# Altium footprint library MainFPs.PcbLib: 215 footprints (part 5 of 14) (continued)
## DIP24 [mm]
pads (24):
  rect 2.5x1.5 hole 0.8: 1(0,0)
  oval 2.5x1.5 hole 0.8: 2(0,-2.54) 3(0,-5.08) 4(0,-7.62) 5(0,-10.16) 6(0,-12.7) 7(0,-15.24) 8(0,-17.78) 9(0,-20.32) 10(0,-22.86) 11(0,-25.4) 12(0,-27.94) 13(7.62,-27.94) 14(7.62,-25.4) 15(7.62,-22.86) 16(7.62,-20.32) 17(7.62,-17.78) 18(7.62,-15.24) 19(7.62,-12.7) 20(7.62,-10.16) 21(7.62,-7.62) 22(7.62,-5.08) 23(7.62,-2.54) 24(7.62,0)
Top Overlay:
  lines w0.2: 3.048,1.27 1.524,1.27 1.524,-29.21 6.096,-29.21 6.096,1.27 4.572,1.27
  lines w0.25: 3.092,1.27 ccw(c3.81,1.27) 4.528,1.27
  text "DIP24" at 4.826,-18.415 h2
Top Draw:
  lines w0.2: 0.254,-28.194 1.524,-29.464 ; 0.254,-26.924 2.794,-29.464 ; 0.254,-25.654 1.524,-26.924 4.064,-29.464 ; 0.254,-24.384 2.794,-26.924 5.334,-29.464 ; 0.254,-23.114 1.524,-24.384 4.064,-26.924 6.604,-29.464 ; 0.254,-21.844 2.794,-24.384 5.334,-26.924 7.366,-28.956 ; 0.254,-20.574 1.524,-21.844 4.064,-24.384 6.604,-26.924 7.366,-27.686 ; 0.254,-19.304 2.794,-21.844 5.334,-24.384 7.366,-26.416 ; 0.254,-18.034 1.524,-19.304 4.064,-21.844 6.604,-24.384 7.366,-25.146 ; 0.254,-16.764 2.794,-19.304 5.334,-21.844 7.366,-23.876 ; 0.254,-15.494 1.524,-16.764 4.064,-19.304 6.604,-21.844 7.366,-22.606 ; 0.254,-14.224 2.794,-16.764 5.334,-19.304 7.366,-21.336 ; 0.254,-12.954 1.524,-14.224 4.064,-16.764 6.604,-19.304 7.366,-20.066 ; 0.254,-11.684 2.794,-14.224 5.334,-16.764 7.366,-18.796 ; 0.254,-10.414 1.524,-11.684 ; 0.254,-9.144 2.794,-11.684 ; 0.254,-7.874 4.064,-11.684 6.604,-14.224 7.366,-14.986 ; 0.254,-6.604 5.334,-11.684 7.366,-13.716 ; 0.254,-5.334 6.604,-11.684 7.366,-12.446 ; 0.254,-4.064 7.366,-11.176 ; 0.254,-2.794 7.366,-9.906 ; 0.254,-1.524 7.366,-8.636 ; 0.254,-0.254 7.366,-7.366 ; 0.254,1.016 7.366,-6.096 ; 1.016,1.524 7.366,-4.826 ; 2.286,1.524 7.366,-3.556 ; 3.556,1.524 7.366,-2.286 ; 4.826,1.524 7.366,-1.016 ; 6.096,1.524 7.366,0.254 ; 7.366,-17.526 6.604,-16.764 4.064,-14.224 ; 7.366,-16.256 5.334,-14.224 ; 2.794,-11.684 5.334,-14.224 ; 2.794,-11.684 5.334,-14.224 ; 4.064,-14.224 1.27,-11.43 4.064,-14.224 ; 0.254,-29.464 0.254,1.524 7.366,1.524 7.366,-29.464 0.254,-29.464
Top Info:
  text "'.Comment'" at -0.381,-30.861 h1
3D body: height 2.03, standoff 0.25, extent 0.508,-29.21 7.112,1.27
3D body: height 3, standoff 2, extent 0.508,-29.21 7.112,1.27
3D body: height 2.09, standoff 0.31, extent -0.127,-5.58 0.508,-4.58
3D body: height 0.38, standoff -3, extent -0.127,-5.334 0.127,-4.826
3D body: height 2.09, standoff 0.31, extent -0.127,-8.12 0.508,-7.12
3D body: height 0.38, standoff -3, extent -0.127,-7.874 0.127,-7.366
3D body: height 2.09, standoff 0.31, extent 7.112,-8.12 7.747,-7.12
3D body: height 0.38, standoff -3, extent 7.493,-7.874 7.747,-7.366
3D body: height 2.09, standoff 0.31, extent 7.112,-5.58 7.747,-4.58
3D body: height 0.38, standoff -3, extent 7.493,-5.334 7.747,-4.826
3D body: height 2.09, standoff 0.31, extent -0.127,-0.5 0.508,0.5
3D body: height 0.38, standoff -3, extent -0.127,-0.254 0.127,0.254
3D body: height 2.09, standoff 0.31, extent -0.127,-3.04 0.508,-2.04
3D body: height 0.38, standoff -3, extent -0.127,-2.794 0.127,-2.286
3D body: height 2.09, standoff 0.31, extent 7.112,-3.04 7.747,-2.04
3D body: height 0.38, standoff -3, extent 7.493,-2.794 7.747,-2.286
3D body: height 2.09, standoff 0.31, extent 7.112,-0.5 7.747,0.5
3D body: height 0.38, standoff -3, extent 7.493,-0.254 7.747,0.254
3D body: height 2.09, standoff 0.31, extent -0.127,-15.74 0.508,-14.74
3D body: height 0.38, standoff -3, extent -0.127,-15.494 0.127,-14.986
3D body: height 2.09, standoff 0.31, extent -0.127,-18.28 0.508,-17.28
3D body: height 0.38, standoff -3, extent -0.127,-18.034 0.127,-17.526
3D body: height 2.09, standoff 0.31, extent 7.112,-18.28 7.747,-17.28
3D body: height 0.38, standoff -3, extent 7.493,-18.034 7.747,-17.526
3D body: height 2.09, standoff 0.31, extent 7.112,-15.74 7.747,-14.74
3D body: height 0.38, standoff -3, extent 7.493,-15.494 7.747,-14.986
3D body: height 2.09, standoff 0.31, extent -0.127,-10.66 0.508,-9.66
3D body: height 0.38, standoff -3, extent -0.127,-10.414 0.127,-9.906
3D body: height 2.09, standoff 0.31, extent -0.127,-13.2 0.508,-12.2
3D body: height 0.38, standoff -3, extent -0.127,-12.954 0.127,-12.446
3D body: height 2.09, standoff 0.31, extent 7.112,-13.2 7.747,-12.2
3D body: height 0.38, standoff -3, extent 7.493,-12.954 7.747,-12.446
3D body: height 2.09, standoff 0.31, extent 7.112,-10.66 7.747,-9.66
3D body: height 0.38, standoff -3, extent 7.493,-10.414 7.747,-9.906
3D body: height 2.09, standoff 0.31, extent -0.127,-25.9 0.508,-24.9
3D body: height 0.38, standoff -3, extent -0.127,-25.654 0.127,-25.146
3D body: height 2.09, standoff 0.31, extent -0.127,-28.44 0.508,-27.44
3D body: height 0.38, standoff -3, extent -0.127,-28.194 0.127,-27.686
3D body: height 2.09, standoff 0.31, extent 7.112,-28.44 7.747,-27.44
3D body: height 0.38, standoff -3, extent 7.493,-28.194 7.747,-27.686
3D body: height 2.09, standoff 0.31, extent 7.112,-25.9 7.747,-24.9
3D body: height 0.38, standoff -3, extent 7.493,-25.654 7.747,-25.146
3D body: height 2.09, standoff 0.31, extent -0.127,-20.82 0.508,-19.82
3D body: height 0.38, standoff -3, extent -0.127,-20.574 0.127,-20.066
3D body: height 2.09, standoff 0.31, extent -0.127,-23.36 0.508,-22.36
3D body: height 0.38, standoff -3, extent -0.127,-23.114 0.127,-22.606
3D body: height 2.09, standoff 0.31, extent 7.112,-23.36 7.747,-22.36
3D body: height 0.38, standoff -3, extent 7.493,-23.114 7.747,-22.606
3D body: height 2.09, standoff 0.31, extent 7.112,-20.82 7.747,-19.82
3D body: height 0.38, standoff -3, extent 7.493,-20.574 7.747,-20.066

## DIP26 [mm]
pads (26):
  rect 2.5x1.5 hole 0.8: 1(0,0)
  oval 2.5x1.5 hole 0.8: 2(0,-2.54) 3(0,-5.08) 4(0,-7.62) 5(0,-10.16) 6(0,-12.7) 7(0,-15.24) 8(0,-17.78) 9(0,-20.32) 10(0,-22.86) 11(0,-25.4) 12(0,-27.94) 13(0,-30.48) 14(7.62,-30.48) 15(7.62,-27.94) 16(7.62,-25.4) 17(7.62,-22.86) 18(7.62,-20.32) 19(7.62,-17.78) 20(7.62,-15.24) 21(7.62,-12.7) 22(7.62,-10.16) 23(7.62,-7.62) 24(7.62,-5.08) 25(7.62,-2.54) 26(7.62,0)
Top Overlay:
  lines w0.2: 3.048,1.27 1.524,1.27 1.524,-31.75 6.096,-31.75 6.096,1.27 4.572,1.27
  lines w0.25: 3.092,1.27 ccw(c3.81,1.27) 4.528,1.27
  text "DIP26" at 4.953,-19.685 h2
Top Draw:
  lines w0.2: 0.254,-30.734 1.524,-32.004 ; 0.254,-29.464 2.794,-32.004 ; 0.254,-28.194 1.524,-29.464 4.064,-32.004 ; 0.254,-26.924 2.794,-29.464 5.334,-32.004 ; 0.254,-25.654 1.524,-26.924 4.064,-29.464 6.604,-32.004 ; 0.254,-24.384 2.794,-26.924 5.334,-29.464 7.366,-31.496 ; 0.254,-23.114 1.524,-24.384 4.064,-26.924 6.604,-29.464 7.366,-30.226 ; 0.254,-21.844 2.794,-24.384 5.334,-26.924 7.366,-28.956 ; 0.254,-20.574 1.524,-21.844 4.064,-24.384 6.604,-26.924 7.366,-27.686 ; 0.254,-19.304 2.794,-21.844 5.334,-24.384 7.366,-26.416 ; 0.254,-18.034 1.524,-19.304 4.064,-21.844 6.604,-24.384 7.366,-25.146 ; 0.254,-16.764 2.794,-19.304 5.334,-21.844 7.366,-23.876 ; 0.254,-15.494 1.524,-16.764 4.064,-19.304 6.604,-21.844 7.366,-22.606 ; 0.254,-14.224 2.794,-16.764 5.334,-19.304 7.366,-21.336 ; 0.254,-12.954 1.524,-14.224 4.064,-16.764 6.604,-19.304 7.366,-20.066 ; 0.254,-11.684 2.794,-14.224 5.334,-16.764 7.366,-18.796 ; 0.254,-10.414 1.524,-11.684 ; 0.254,-9.144 2.794,-11.684 ; 0.254,-7.874 4.064,-11.684 6.604,-14.224 7.366,-14.986 ; 0.254,-6.604 5.334,-11.684 7.366,-13.716 ; 0.254,-5.334 6.604,-11.684 7.366,-12.446 ; 0.254,-4.064 7.366,-11.176 ; 0.254,-2.794 7.366,-9.906 ; 0.254,-1.524 7.366,-8.636 ; 0.254,-0.254 7.366,-7.366 ; 0.254,1.016 7.366,-6.096 ; 1.016,1.524 7.366,-4.826 ; 2.286,1.524 7.366,-3.556 ; 3.556,1.524 7.366,-2.286 ; 4.826,1.524 7.366,-1.016 ; 6.096,1.524 7.366,0.254 ; 7.366,-17.526 6.604,-16.764 4.064,-14.224 ; 7.366,-16.256 5.334,-14.224 ; 2.794,-11.684 5.334,-14.224 ; 2.794,-11.684 5.334,-14.224 ; 4.064,-14.224 1.27,-11.43 4.064,-14.224 ; 0.254,-32.004 0.254,1.524 7.366,1.524 7.366,1.27 7.366,-32.004 0.254,-32.004
Top Info:
  text "'.Comment'" at -0.381,-33.401 h1
3D body: height 0.38, standoff -3, extent 7.493,-30.734 7.747,-30.226
3D body: height 2.09, standoff 0.31, extent 7.112,-30.98 7.747,-29.98
3D body: height 0.38, standoff -3, extent -0.127,-30.734 0.127,-30.226
3D body: height 2.09, standoff 0.31, extent -0.127,-30.98 0.508,-29.98
3D body: height 0.38, standoff -3, extent 7.493,-20.574 7.747,-20.066
3D body: height 2.09, standoff 0.31, extent 7.112,-20.82 7.747,-19.82
3D body: height 0.38, standoff -3, extent 7.493,-23.114 7.747,-22.606
3D body: height 2.09, standoff 0.31, extent 7.112,-23.36 7.747,-22.36
3D body: height 0.38, standoff -3, extent -0.127,-23.114 0.127,-22.606
3D body: height 2.09, standoff 0.31, extent -0.127,-23.36 0.508,-22.36
3D body: height 0.38, standoff -3, extent -0.127,-20.574 0.127,-20.066
3D body: height 2.09, standoff 0.31, extent -0.127,-20.82 0.508,-19.82
3D body: height 0.38, standoff -3, extent 7.493,-25.654 7.747,-25.146
3D body: height 2.09, standoff 0.31, extent 7.112,-25.9 7.747,-24.9
3D body: height 0.38, standoff -3, extent 7.493,-28.194 7.747,-27.686
3D body: height 2.09, standoff 0.31, extent 7.112,-28.44 7.747,-27.44
3D body: height 0.38, standoff -3, extent -0.127,-28.194 0.127,-27.686
3D body: height 2.09, standoff 0.31, extent -0.127,-28.44 0.508,-27.44
3D body: height 0.38, standoff -3, extent -0.127,-25.654 0.127,-25.146
3D body: height 2.09, standoff 0.31, extent -0.127,-25.9 0.508,-24.9
3D body: height 0.38, standoff -3, extent 7.493,-10.414 7.747,-9.906
3D body: height 2.09, standoff 0.31, extent 7.112,-10.66 7.747,-9.66
3D body: height 0.38, standoff -3, extent 7.493,-12.954 7.747,-12.446
3D body: height 2.09, standoff 0.31, extent 7.112,-13.2 7.747,-12.2
3D body: height 0.38, standoff -3, extent -0.127,-12.954 0.127,-12.446
3D body: height 2.09, standoff 0.31, extent -0.127,-13.2 0.508,-12.2
3D body: height 0.38, standoff -3, extent -0.127,-10.414 0.127,-9.906
3D body: height 2.09, standoff 0.31, extent -0.127,-10.66 0.508,-9.66
3D body: height 0.38, standoff -3, extent 7.493,-15.494 7.747,-14.986
3D body: height 2.09, standoff 0.31, extent 7.112,-15.74 7.747,-14.74
3D body: height 0.38, standoff -3, extent 7.493,-18.034 7.747,-17.526
3D body: height 2.09, standoff 0.31, extent 7.112,-18.28 7.747,-17.28
3D body: height 0.38, standoff -3, extent -0.127,-18.034 0.127,-17.526
3D body: height 2.09, standoff 0.31, extent -0.127,-18.28 0.508,-17.28
3D body: height 0.38, standoff -3, extent -0.127,-15.494 0.127,-14.986
3D body: height 2.09, standoff 0.31, extent -0.127,-15.74 0.508,-14.74
3D body: height 0.38, standoff -3, extent 7.493,-0.254 7.747,0.254
3D body: height 2.09, standoff 0.31, extent 7.112,-0.5 7.747,0.5
3D body: height 0.38, standoff -3, extent 7.493,-2.794 7.747,-2.286
3D body: height 2.09, standoff 0.31, extent 7.112,-3.04 7.747,-2.04
3D body: height 0.38, standoff -3, extent -0.127,-2.794 0.127,-2.286
3D body: height 2.09, standoff 0.31, extent -0.127,-3.04 0.508,-2.04
3D body: height 0.38, standoff -3, extent -0.127,-0.254 0.127,0.254
3D body: height 2.09, standoff 0.31, extent -0.127,-0.5 0.508,0.5
3D body: height 0.38, standoff -3, extent 7.493,-5.334 7.747,-4.826
3D body: height 2.09, standoff 0.31, extent 7.112,-5.58 7.747,-4.58
3D body: height 0.38, standoff -3, extent 7.493,-7.874 7.747,-7.366
3D body: height 2.09, standoff 0.31, extent 7.112,-8.12 7.747,-7.12
3D body: height 0.38, standoff -3, extent -0.127,-7.874 0.127,-7.366
3D body: height 2.09, standoff 0.31, extent -0.127,-8.12 0.508,-7.12
3D body: height 0.38, standoff -3, extent -0.127,-5.334 0.127,-4.826
3D body: height 2.09, standoff 0.31, extent -0.127,-5.58 0.508,-4.58
3D body: height 2.03, standoff 0.25, extent 0.508,-31.75 7.112,1.27
3D body: height 3, standoff 2, extent 0.508,-31.75 7.112,1.27

## DIP28 [mm]
pads (28):
  rect 2.5x1.5 hole 0.8: 1(0,0)
  oval 2.5x1.5 hole 0.8: 2(0,-2.54) 3(0,-5.08) 4(0,-7.62) 5(0,-10.16) 6(0,-12.7) 7(0,-15.24) 8(0,-17.78) 9(0,-20.32) 10(0,-22.86) 11(0,-25.4) 12(0,-27.94) 13(0,-30.48) 14(0,-33.02) 15(7.62,-33.02) 16(7.62,-30.48) 17(7.62,-27.94) 18(7.62,-25.4) 19(7.62,-22.86) 20(7.62,-20.32) 21(7.62,-17.78) 22(7.62,-15.24) 23(7.62,-12.7) 24(7.62,-10.16) 25(7.62,-7.62) 26(7.62,-5.08) 27(7.62,-2.54) 28(7.62,0)
Top Overlay:
  lines w0.2: 3.048,1.27 1.524,1.27 1.524,-34.29 6.096,-34.29 6.096,1.27 4.572,1.27
  lines w0.25: 3.092,1.27 ccw(c3.81,1.27) 4.528,1.27
  text "DIP28" at 4.445,-19.304 h1.27
Top Draw:
  lines w0.2: 0.254,-33.274 1.524,-34.544 ; 0.254,-32.004 2.794,-34.544 ; 0.254,-30.734 1.524,-32.004 4.064,-34.544 ; 0.254,-29.464 2.794,-32.004 5.334,-34.544 ; 0.254,-28.194 1.524,-29.464 4.064,-32.004 6.604,-34.544 ; 0.254,-26.924 2.794,-29.464 5.334,-32.004 7.366,-34.036 ; 0.254,-25.654 1.524,-26.924 4.064,-29.464 6.604,-32.004 7.366,-32.766 ; 0.254,-24.384 2.794,-26.924 5.334,-29.464 7.366,-31.496 ; 0.254,-23.114 1.524,-24.384 4.064,-26.924 6.604,-29.464 7.366,-30.226 ; 0.254,-21.844 2.794,-24.384 5.334,-26.924 7.366,-28.956 ; 0.254,-20.574 1.524,-21.844 4.064,-24.384 6.604,-26.924 7.366,-27.686 ; 0.254,-19.304 2.794,-21.844 5.334,-24.384 7.366,-26.416 ; 0.254,-18.034 1.524,-19.304 4.064,-21.844 6.604,-24.384 7.366,-25.146 ; 0.254,-16.764 2.794,-19.304 5.334,-21.844 7.366,-23.876 ; 0.254,-15.494 1.524,-16.764 4.064,-19.304 6.604,-21.844 7.366,-22.606 ; 0.254,-14.224 2.794,-16.764 5.334,-19.304 7.366,-21.336 ; 0.254,-12.954 1.524,-14.224 4.064,-16.764 6.604,-19.304 7.366,-20.066 ; 0.254,-11.684 2.794,-14.224 5.334,-16.764 7.366,-18.796 ; 0.254,-10.414 1.524,-11.684 ; 0.254,-9.144 2.794,-11.684 ; 0.254,-7.874 4.064,-11.684 6.604,-14.224 7.366,-14.986 ; 0.254,-6.604 5.334,-11.684 7.366,-13.716 ; 0.254,-5.334 6.604,-11.684 7.366,-12.446 ; 0.254,-4.064 7.366,-11.176 ; 0.254,-2.794 7.366,-9.906 ; 0.254,-1.524 7.366,-8.636 ; 0.254,-0.254 7.366,-7.366 ; 0.254,1.016 7.366,-6.096 ; 1.016,1.524 7.366,-4.826 ; 2.286,1.524 7.366,-3.556 ; 3.556,1.524 7.366,-2.286 ; 4.826,1.524 7.366,-1.016 ; 6.096,1.524 7.366,0.254 ; 7.366,-17.526 6.604,-16.764 4.064,-14.224 ; 7.366,-16.256 5.334,-14.224 ; 2.794,-11.684 5.334,-14.224 ; 2.794,-11.684 5.334,-14.224 ; 4.064,-14.224 1.27,-11.43 4.064,-14.224 ; 0.254,-34.544 7.366,-34.544 7.366,1.524 0.254,1.524 0.254,-34.544
Top Info:
  text "'.Comment'" at -0.381,-35.941 h1
3D body: height 0.38, standoff -3, extent 7.493,-30.734 7.747,-30.226
3D body: height 2.09, standoff 0.31, extent 7.112,-30.98 7.747,-29.98
3D body: height 0.38, standoff -3, extent 7.493,-33.274 7.747,-32.766
3D body: height 2.09, standoff 0.31, extent 7.112,-33.52 7.747,-32.52
3D body: height 0.38, standoff -3, extent -0.127,-33.274 0.127,-32.766
3D body: height 2.09, standoff 0.31, extent -0.127,-33.52 0.508,-32.52
3D body: height 0.38, standoff -3, extent -0.127,-30.734 0.127,-30.226
3D body: height 2.09, standoff 0.31, extent -0.127,-30.98 0.508,-29.98
3D body: height 0.38, standoff -3, extent 7.493,-20.574 7.747,-20.066
3D body: height 2.09, standoff 0.31, extent 7.112,-20.82 7.747,-19.82
3D body: height 0.38, standoff -3, extent 7.493,-23.114 7.747,-22.606
3D body: height 2.09, standoff 0.31, extent 7.112,-23.36 7.747,-22.36
3D body: height 0.38, standoff -3, extent -0.127,-23.114 0.127,-22.606
3D body: height 2.09, standoff 0.31, extent -0.127,-23.36 0.508,-22.36
3D body: height 0.38, standoff -3, extent -0.127,-20.574 0.127,-20.066
3D body: height 2.09, standoff 0.31, extent -0.127,-20.82 0.508,-19.82
3D body: height 0.38, standoff -3, extent 7.493,-25.654 7.747,-25.146
3D body: height 2.09, standoff 0.31, extent 7.112,-25.9 7.747,-24.9
3D body: height 0.38, standoff -3, extent 7.493,-28.194 7.747,-27.686
3D body: height 2.09, standoff 0.31, extent 7.112,-28.44 7.747,-27.44
3D body: height 0.38, standoff -3, extent -0.127,-28.194 0.127,-27.686
3D body: height 2.09, standoff 0.31, extent -0.127,-28.44 0.508,-27.44
3D body: height 0.38, standoff -3, extent -0.127,-25.654 0.127,-25.146
3D body: height 2.09, standoff 0.31, extent -0.127,-25.9 0.508,-24.9
3D body: height 0.38, standoff -3, extent 7.493,-10.414 7.747,-9.906
3D body: height 2.09, standoff 0.31, extent 7.112,-10.66 7.747,-9.66
3D body: height 0.38, standoff -3, extent 7.493,-12.954 7.747,-12.446
3D body: height 2.09, standoff 0.31, extent 7.112,-13.2 7.747,-12.2
3D body: height 0.38, standoff -3, extent -0.127,-12.954 0.127,-12.446
3D body: height 2.09, standoff 0.31, extent -0.127,-13.2 0.508,-12.2
3D body: height 0.38, standoff -3, extent -0.127,-10.414 0.127,-9.906
3D body: height 2.09, standoff 0.31, extent -0.127,-10.66 0.508,-9.66
3D body: height 0.38, standoff -3, extent 7.493,-15.494 7.747,-14.986
3D body: height 2.09, standoff 0.31, extent 7.112,-15.74 7.747,-14.74
3D body: height 0.38, standoff -3, extent 7.493,-18.034 7.747,-17.526
3D body: height 2.09, standoff 0.31, extent 7.112,-18.28 7.747,-17.28
3D body: height 0.38, standoff -3, extent -0.127,-18.034 0.127,-17.526
3D body: height 2.09, standoff 0.31, extent -0.127,-18.28 0.508,-17.28
3D body: height 0.38, standoff -3, extent -0.127,-15.494 0.127,-14.986
3D body: height 2.09, standoff 0.31, extent -0.127,-15.74 0.508,-14.74
3D body: height 0.38, standoff -3, extent 7.493,-0.254 7.747,0.254
3D body: height 2.09, standoff 0.31, extent 7.112,-0.5 7.747,0.5
3D body: height 0.38, standoff -3, extent 7.493,-2.794 7.747,-2.286
3D body: height 2.09, standoff 0.31, extent 7.112,-3.04 7.747,-2.04
3D body: height 0.38, standoff -3, extent -0.127,-2.794 0.127,-2.286
3D body: height 2.09, standoff 0.31, extent -0.127,-3.04 0.508,-2.04
3D body: height 0.38, standoff -3, extent -0.127,-0.254 0.127,0.254
3D body: height 2.09, standoff 0.31, extent -0.127,-0.5 0.508,0.5
3D body: height 0.38, standoff -3, extent 7.493,-5.334 7.747,-4.826
3D body: height 2.09, standoff 0.31, extent 7.112,-5.58 7.747,-4.58
3D body: height 0.38, standoff -3, extent 7.493,-7.874 7.747,-7.366
3D body: height 2.09, standoff 0.31, extent 7.112,-8.12 7.747,-7.12
3D body: height 0.38, standoff -3, extent -0.127,-7.874 0.127,-7.366
3D body: height 2.09, standoff 0.31, extent -0.127,-8.12 0.508,-7.12
3D body: height 0.38, standoff -3, extent -0.127,-5.334 0.127,-4.826
3D body: height 2.09, standoff 0.31, extent -0.127,-5.58 0.508,-4.58
3D body: height 2.03, standoff 0.25, extent 0.508,-34.29 7.112,1.27
3D body: height 3, standoff 2, extent 0.508,-34.29 7.112,1.27

## DIP_SW1 [mm]
pads (2):
  oval 1.6x2.4 hole 0.8: 1(0,0) 2(0,-7.62)
Top Overlay:
  lines w0.2: -1.524,-9.144 -1.524,1.524 1.524,1.524 1.524,-9.144 -1.524,-9.144
  text "DIP_SW1" at 0.36,-6.073 h0.75
  text "ON" at -4.318,0 h1.27
Top Draw:
  lines w0.2: -1.778,-7.874 -0.508,-9.144 ; -1.778,-6.604 0.762,-9.144 ; -1.778,-5.334 1.524,-8.636 ; -1.778,-4.064 1.524,-7.366 ; -1.778,-2.794 1.524,-6.096 ; -1.778,-1.524 1.524,-4.826 ; -1.778,-0.254 1.524,-3.556 ; -1.778,1.016 1.524,-2.286 ; -1.016,1.524 1.524,-1.016 ; 0.254,1.524 1.524,0.254 ; -1.778,-9.144 1.524,-9.144 1.524,1.524 -1.778,1.524 -1.778,-9.144
Top Info:
  text "'.Comment'" at -5.311,-11.029 h1.25
3D body: height 7.62, standoff 6.32, extent -0.762,-3.302 0.762,-2.032
3D body: height 6.86, standoff 6.32, extent 0.762,-5.588 1.524,-2.032
3D body: height 6.86, standoff 6.32, extent -1.524,-5.588 -0.762,-2.032
3D body: height 0.25, standoff -1.78, extent -0.254,-0.127 0.254,0.127
3D body: height 0.25, standoff -1.78, extent -0.254,-7.747 0.254,-7.493
3D body: height 6.35, standoff 0, extent -1.778,-9.144 1.524,1.524
3D body: height 6.86, standoff 0.25, extent -1.778,-2.032 1.524,1.524
3D body: height 6.86, standoff 0.25, extent -1.778,-9.144 1.524,-5.588
3D body: height 6.43, standoff 6.32, extent -0.762,-5.588 0.762,-2.032

## DIP_SW2 [mm]
pads (4):
  oval 1.6x2.4 hole 0.8: 1(0,0) 2(2.54,0) 3(2.54,-7.62) 4(0,-7.62)
Top Overlay:
  lines w0.2: -1.524,-9.144 4.064,-9.144 4.064,1.524 -1.524,1.524 -1.524,-9.144
  text "ON" at -4.318,0 h1.27
  text "DIP" at -0.131,-3.306 h1.25
  text "SW2" at -0.258,-5.465 h1.25
Top Draw:
  lines w0.2: -1.778,-7.874 -0.508,-9.144 ; -1.778,-6.604 0.762,-9.144 ; -1.778,-5.334 2.032,-9.144 ; -1.778,-4.064 3.302,-9.144 ; -1.778,-2.794 4.064,-8.636 ; -1.778,-1.524 4.064,-7.366 ; -1.778,-0.254 4.064,-6.096 ; -1.778,1.016 4.064,-4.826 ; -1.016,1.524 4.064,-3.556 ; 0.254,1.524 4.064,-2.286 ; 1.524,1.524 4.064,-1.016 ; 2.794,1.524 4.064,0.254 ; -1.778,-9.144 -1.778,1.524 4.064,1.524 4.064,-9.144 -1.778,-9.144
Top Info:
  text "'.Comment'" at -4.041,-11.016 h1.25
3D body: height 7.62, standoff 6.32, extent 1.778,-3.302 3.302,-2.032
3D body: height 6.43, standoff 6.32, extent 1.778,-5.588 3.302,-2.032
3D body: height 6.43, standoff 6.32, extent -0.762,-5.588 0.762,-2.032
3D body: height 6.86, standoff 6.32, extent 3.302,-5.588 4.064,-2.032
3D body: height 6.86, standoff 0.25, extent -1.778,-9.144 4.064,-5.588
3D body: height 6.86, standoff 0.25, extent -1.778,-2.032 4.064,1.524
3D body: height 6.35, standoff 0, extent -1.778,-9.144 4.064,1.524
3D body: height 0.25, standoff -1.78, extent -0.254,-7.747 0.254,-7.493
3D body: height 0.25, standoff -1.78, extent 2.286,-7.747 2.794,-7.493
3D body: height 0.25, standoff -1.78, extent -0.254,-0.127 0.254,0.127
3D body: height 0.25, standoff -1.78, extent 2.286,-0.127 2.794,0.127
3D body: height 6.86, standoff 6.32, extent -1.524,-5.588 -0.762,-2.032
3D body: height 6.86, standoff 6.32, extent 0.762,-5.588 1.778,-2.032
3D body: height 7.62, standoff 6.32, extent -0.762,-3.302 0.762,-2.032

## DIP_SW3 [mm]
pads (6):
  oval 1.6x2.4 hole 0.8: 1(0,0) 2(2.54,0) 3(5.08,0) 4(5.08,-7.62) 5(2.54,-7.62) 6(0,-7.62)
Top Overlay:
  lines w0.2: -1.524,-9.144 6.604,-9.144 6.604,1.524 -1.524,1.524 -1.524,-9.144
  text "ON" at -4.318,0 h1.27
  text "DIP" at 1.012,-3.306 h1.25
  text "SW3" at 0.885,-5.465 h1.25
Top Draw:
  lines w0.2: -1.778,-7.874 -0.508,-9.144 ; -1.778,-6.604 0.762,-9.144 ; -1.778,-5.334 2.032,-9.144 ; -1.778,-4.064 3.302,-9.144 ; -1.778,-2.794 4.572,-9.144 ; -1.778,-1.524 5.842,-9.144 ; -1.778,-0.254 6.604,-8.636 ; -1.778,1.016 6.604,-7.366 ; -1.016,1.524 6.604,-6.096 ; 0.254,1.524 6.604,-4.826 ; 1.524,1.524 6.604,-3.556 ; 2.794,1.524 6.604,-2.286 ; 4.064,1.524 6.604,-1.016 ; 5.334,1.524 6.604,0.254 ; -1.778,-9.144 -1.778,1.524 6.604,1.524 6.604,-9.144 -1.778,-9.144
Top Info:
  text "'.Comment'" at -2.771,-11.016 h1.25
3D body: height 7.62, standoff 6.32, extent 4.318,-3.302 5.842,-2.032
3D body: height 6.43, standoff 6.32, extent 4.318,-5.588 5.842,-2.032
3D body: height 7.62, standoff 6.32, extent 1.778,-3.302 3.302,-2.032
3D body: height 6.43, standoff 6.32, extent 1.778,-5.588 3.302,-2.032
3D body: height 6.43, standoff 6.32, extent -0.762,-5.588 0.762,-2.032
3D body: height 6.86, standoff 6.32, extent 5.842,-5.588 6.604,-2.032
3D body: height 6.86, standoff 6.32, extent 3.302,-5.588 4.318,-2.032
3D body: height 6.86, standoff 0.25, extent -1.778,-9.144 6.604,-5.588
3D body: height 6.86, standoff 0.25, extent -1.778,-2.032 6.604,1.524
3D body: height 6.35, standoff 0, extent -1.778,-9.144 6.604,1.524
3D body: height 0.25, standoff -1.78, extent -0.254,-7.747 0.254,-7.493
3D body: height 0.25, standoff -1.78, extent 2.286,-7.747 2.794,-7.493
3D body: height 0.25, standoff -1.78, extent 4.826,-7.747 5.334,-7.493
3D body: height 0.25, standoff -1.78, extent -0.254,-0.127 0.254,0.127
3D body: height 0.25, standoff -1.78, extent 2.286,-0.127 2.794,0.127
3D body: height 0.25, standoff -1.78, extent 4.826,-0.127 5.334,0.127
3D body: height 6.86, standoff 6.32, extent -1.524,-5.588 -0.762,-2.032
3D body: height 6.86, standoff 6.32, extent 0.762,-5.588 1.778,-2.032
3D body: height 7.62, standoff 6.32, extent -0.762,-3.302 0.762,-2.032

## DIP_SW4 [mm]
pads (8):
  oval 1.6x2.4 hole 0.8: 1(0,0) 2(2.54,0) 3(5.08,0) 4(7.62,0) 5(7.62,-7.62) 6(5.08,-7.62) 7(2.54,-7.62) 8(0,-7.62)
Top Overlay:
  lines w0.2: -1.524,-9.144 9.144,-9.144 9.144,1.524 -1.524,1.524 -1.524,-9.144
  text "ON" at -4.318,0 h1.27
  text "DIP_SW4" at -0.254,-4.318 h1.27
Top Draw:
  lines w0.2: -1.778,-7.874 -0.508,-9.144 ; -1.778,-6.604 0.762,-9.144 ; -1.778,-5.334 2.032,-9.144 ; -1.778,-4.064 3.302,-9.144 ; -1.778,-2.794 4.572,-9.144 ; -1.778,-1.524 5.842,-9.144 ; -1.778,-0.254 7.112,-9.144 ; -1.778,1.016 8.382,-9.144 ; -1.016,1.524 9.398,-8.89 ; 0.254,1.524 9.398,-7.62 ; 1.524,1.524 9.398,-6.35 ; 2.794,1.524 9.398,-5.08 ; 4.064,1.524 9.398,-3.81 ; 5.334,1.524 9.398,-2.54 ; 6.604,1.524 9.398,-1.27 ; 7.874,1.524 9.398,0 ; 9.144,1.524 9.398,1.27 ; -1.778,-9.144 -1.778,1.524 9.398,1.524 9.398,-9.144 -1.778,-9.144
Top Info:
  text "'.Comment'" at -1.501,-11.016 h1.25
3D body: height 7.62, standoff 6.32, extent 6.858,-3.302 8.382,-2.032
3D body: height 6.43, standoff 6.32, extent 6.858,-5.588 8.382,-2.032
3D body: height 7.62, standoff 6.32, extent 4.318,-3.302 5.842,-2.032
3D body: height 6.43, standoff 6.32, extent 4.318,-5.588 5.842,-2.032
3D body: height 7.62, standoff 6.32, extent 1.778,-3.302 3.302,-2.032
3D body: height 6.43, standoff 6.32, extent 1.778,-5.588 3.302,-2.032
3D body: height 6.43, standoff 6.32, extent -0.762,-5.588 0.762,-2.032
3D body: height 6.86, standoff 6.32, extent 8.382,-5.588 9.398,-2.032
3D body: height 6.86, standoff 6.32, extent 5.842,-5.588 6.858,-2.032
3D body: height 6.86, standoff 6.32, extent 3.302,-5.588 4.318,-2.032
3D body: height 6.86, standoff 0.25, extent -1.778,-9.144 9.398,-5.588
3D body: height 6.86, standoff 0.25, extent -1.778,-2.032 9.398,1.524
3D body: height 6.35, standoff 0, extent -1.778,-9.144 9.398,1.524
3D body: height 0.25, standoff -1.78, extent -0.254,-7.747 0.254,-7.493
3D body: height 0.25, standoff -1.78, extent 2.286,-7.747 2.794,-7.493
3D body: height 0.25, standoff -1.78, extent 4.826,-7.747 5.334,-7.493
3D body: height 0.25, standoff -1.78, extent -0.254,-0.127 0.254,0.127
3D body: height 0.25, standoff -1.78, extent 2.286,-0.127 2.794,0.127
3D body: height 0.25, standoff -1.78, extent 4.826,-0.127 5.334,0.127
3D body: height 0.25, standoff -1.78, extent 7.366,-0.127 7.874,0.127
3D body: height 0.25, standoff -1.78, extent 7.366,-7.747 7.874,-7.493
3D body: height 6.86, standoff 6.32, extent -1.524,-5.588 -0.762,-2.032
3D body: height 6.86, standoff 6.32, extent 0.762,-5.588 1.778,-2.032
3D body: height 7.62, standoff 6.32, extent -0.762,-3.302 0.762,-2.032